# Altium footprint library Elettronica FM.PcbLib: 387 footprints (part 17 of 25)
Each footprint in its own frame and in the unit in brackets; x right, y up, seen from the top. Pads: shape width x height; smd on the part's side, far side on the other; paste and mask are expansions set on the pad; w line width, h text height; cw(c..) or ccw(c..) is an arc to the next point about the centre after c.
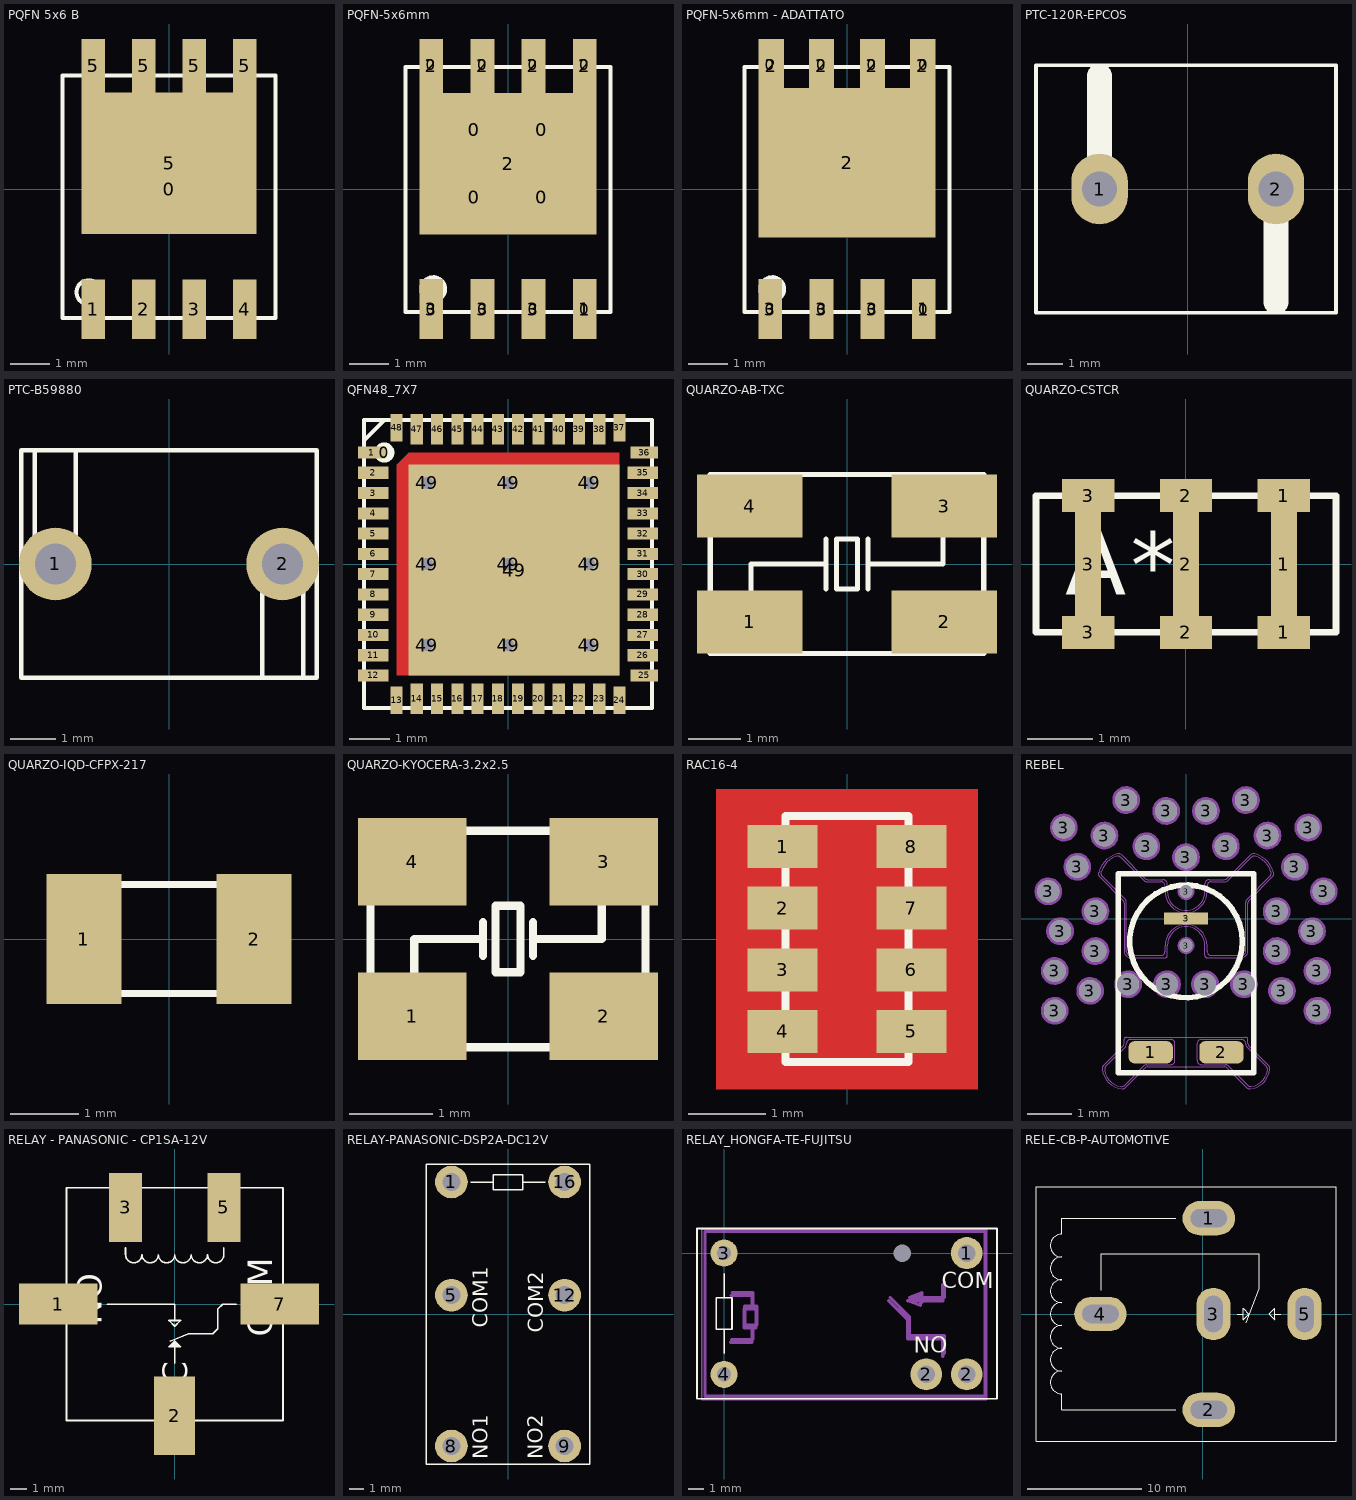
[diagram p16: the footprints below, top view; thin cyan lines are the x and y axes]

## PQFN 5x6 B [mm]
pads (10):
  round 0.8 on Top Overlay mask+0.1: 0(0,0)
  rect 0.6x1.5 smd mask+0: 1(-1.905,-3.02) 2(-0.635,-3.02) 3(0.635,-3.02) 4(1.905,-3.02)
  rect 0.6x1.35 smd mask+0: 5(-1.905,3.095) 5(-0.635,3.095) 5(0.635,3.095) 5(1.905,3.095)
  rect 4.41x3.545 smd mask+0: 5(0,0.647)
Top Overlay:
  circle w0.1: c-2.025,-2.595 r0.3
  lines w0.1: -2.675,-3.245 2.675,-3.245 2.675,2.855 -2.675,2.855 -2.675,-3.245

## PQFN-5x6mm [mm]
pads (21):
  rect 0.5x1.4 on Top Paste mask+0.1: 0(-1.925,-3) 0(-0.635,-3) 0(0.635,-3) 0(1.925,-3)
  rect 0.5x1.2 on Top Paste mask+0.1: 0(-1.925,3.125) 0(-0.635,3.125) 0(0.635,3.125) 0(1.925,3.125)
  rect 1.5x1.5 on Top Paste mask+0.1: 0(-0.85,-0.2) 0(-0.85,1.5) 0(0.85,-0.2) 0(0.85,1.5)
  rect 0.6x1.5 smd paste-5 mask+0: 1(1.925,-3) 3(-1.925,-3) 3(-0.635,-3) 3(0.635,-3)
  rect 0.6x1.35 smd paste-5 mask+0: 2(-1.925,3.1) 2(-0.635,3.1) 2(0.635,3.1) 2(1.925,3.1)
  rect 4.45x3.55 smd paste-5 mask+0: 2(0,0.65)
Top Overlay:
  circle w0.1: c-1.875,-2.5 r0.3
  lines w0.1: -2.575,-3.075 2.575,-3.075 2.575,3.075 -2.575,3.075 -2.575,-3.075
3D body: height 1.1, standoff 0, extent -2.575,-3.075 2.575,3.075

## PQFN-5x6mm - ADATTATO [mm]
pads (17):
  rect 0.5x1.4 on Top Paste mask+0.1: 0(-1.925,-3) 0(-0.635,-3) 0(0.635,-3) 0(1.925,-3)
  rect 0.5x1.2 on Top Paste mask+0.1: 0(-1.925,3.125) 0(-0.635,3.125) 0(0.635,3.125) 0(1.925,3.125)
  rect 0.6x1.5 smd paste-5 mask+0: 1(1.925,-3) 3(-1.925,-3) 3(-0.635,-3) 3(0.635,-3)
  rect 0.65x1.35 smd paste-5 mask+0: 2(-1.9,3.1) 2(1.9,3.1)
  rect 0.625x1.35 smd paste-5 mask+0: 2(-0.635,3.1) 2(0.635,3.1)
  rect 4.45x3.75 smd paste-5 mask+0: 2(0,0.675)
Top Overlay:
  circle w0.1: c-1.875,-2.5 r0.3
  lines w0.1: -2.575,-3.075 2.575,-3.075 2.575,3.075 -2.575,3.075 -2.575,-3.075
Top Paste:
  region: -2.025,2.35 -2.025,-1 2.025,-1 2.025,2.35
Top Solder:
  region: -2.225,3.775 -2.225,-1.2 2.225,-1.2 2.225,3.775 1.575,3.775 1.575,2.55 0.95,2.55 0.95,3.775 0.325,3.775 0.325,2.55 -0.325,2.55 -0.325,3.775 -0.95,3.775 -0.95,2.55 -1.575,2.55 -1.575,3.775
3D body: height 1.1, standoff 0, extent -2.575,-3.075 2.575,3.075

## PTC-120R-EPCOS [mm] "PTC, Diam 8.5, height 12mm, width 7mm Pitch=5mm, PLated"
height 12
pads (2):
  oval 1.6x2 hole 1: 1(-2.5,0) 2(2.5,0)
Top Overlay:
  lines w0.1: -4.3,-3.5 4.2,-3.5 4.2,3.5 -4.3,3.5 -4.3,-3.5
  lines w0.7: -2.5,0 -2.5,3.2 ; 2.5,-3.2 2.5,0
3D body: height 12.1, standoff 3.6, extent -4.25,-3.5 4.25,3.5

## PTC-B59880 [mm]
pads (2):
  round 1.6 hole 0.9: 1(-2.5,0) 2(2.5,0)
Top Overlay:
  lines w0.1: -2.95,2.5 -2.95,-0.45 -2.05,-0.45 -2.05,2.5 ; 2.05,-2.5 2.05,0.45 2.95,0.45 2.95,-2.5 ; -3.25,-2.5 3.25,-2.5 3.25,2.5 -3.25,2.5 -3.25,-2.5
3D body: height 10, standoff 3.5, extent -3.25,-2.5 3.25,2.5
3D body: height 5, standoff -4.3, extent 2.203,-0.299 2.8,0.3
3D body: height 5, standoff -4.3, extent -2.797,-0.299 -2.2,0.3

## QFN48_7X7 [mm]
pads (59):
  round 0.5 on Top Overlay paste+0 mask+0.05: 0(-3.05,2.75)
  rect 0.675x0.3 smd mask+0.05: 1(-3.363,2.75) 25(3.363,-2.75) 36(3.363,2.75)
  rect 0.75x0.3 smd mask+0.05: 2(-3.325,2.25) 3(-3.325,1.75) 4(-3.325,1.25) 5(-3.325,0.75) 6(-3.325,0.25) 7(-3.325,-0.25) 8(-3.325,-0.75) 9(-3.325,-1.25) 10(-3.325,-1.75) 11(-3.325,-2.25) 12(-3.325,-2.75) 26(3.325,-2.25) 27(3.325,-1.75) 28(3.325,-1.25) 29(3.325,-0.75) 30(3.325,-0.25) 31(3.325,0.25) 32(3.325,0.75) 33(3.325,1.25) 34(3.325,1.75) 35(3.325,2.25)
  rect 0.3x0.675 smd mask+0.05: 13(-2.75,-3.363) 24(2.75,-3.363) 37(2.75,3.363) 48(-2.75,3.363)
  rect 0.3x0.75 smd mask+0.05: 14(-2.25,-3.325) 15(-1.75,-3.325) 16(-1.25,-3.325) 17(-0.75,-3.325) 18(-0.25,-3.325) 19(0.25,-3.325) 20(0.75,-3.325) 21(1.25,-3.325) 22(1.75,-3.325) 23(2.25,-3.325) 38(2.25,3.325) 39(1.75,3.325) 40(1.25,3.325) 41(0.75,3.325) 42(0.25,3.325) 43(-0.25,3.325) 44(-0.75,3.325) 45(-1.25,3.325) 46(-1.75,3.325) 47(-2.25,3.325)
  round 0.7 hole 0.3 paste+0 mask+0.05: 49(-2,-2) 49(-2,0) 49(-2,2) 49(0,-2) 49(0,0) 49(0,2) 49(2,-2) 49(2,0) 49(2,2)
  rect 5.2x5.2 smd paste-50 mask+0.05: 49(0.15,-0.15)
Top Layer:
  region: 2.75,-2.75 -2.75,-2.75 -2.75,2.45 -2.45,2.75 2.75,2.75
Top Overlay:
  lines w0.1: -3.55,3.05 -3.05,3.55 ; -3.55,-3.55 3.55,-3.55 3.55,3.55 -3.55,3.55 -3.55,-3.55
Top Paste:
  region: -2.7,0.8 -1.1,0.8 -1.1,-0.8 -2.7,-0.8
  region: -2.7,2.425 -2.425,2.7 -1.1,2.7 -1.1,1.1 -2.7,1.1
  region: -0.8,2.7 0.8,2.7 0.8,1.1 -0.8,1.1
  region: 1.1,2.7 2.7,2.7 2.7,1.1 1.1,1.1
  region: 1.1,0.8 2.7,0.8 2.7,-0.8 1.1,-0.8
  region: 1.1,-1.1 2.7,-1.1 2.7,-2.7 1.1,-2.7
  region: -0.8,-1.1 0.8,-1.1 0.8,-2.7 -0.8,-2.7
  region: -2.7,-1.1 -1.1,-1.1 -1.1,-2.7 -2.7,-2.7
  region: -0.8,0.8 0.8,0.8 0.8,-0.8 -0.8,-0.8
Top Solder:
  region: -2.8,-2.8 -2.8,2.475 -2.475,2.8 2.8,2.8 2.8,-2.8
  lines w0.1: -3.65,3.15 -3.65,3.65 -3.15,3.65 ; 3.15,-3.65 3.65,-3.65 3.65,-3.15

## QUARZO-AB-TXC [mm]
pads (4):
  rect 2x1.2 smd: 1(-1.85,-1.1) 2(1.85,-1.1) 3(1.85,1.1) 4(-1.85,1.1)
Top Overlay:
  lines w0.1: -1.825,-0.85 -1.825,0 -0.4,0 ; -0.4,-0.475 -0.4,0.475 ; 0.4,-0.475 0.4,0.475 ; 0.4,0 1.825,0 1.825,0.85 ; 1.6,-1.7 1.6,-1.225 2.125,-0.7 2.6,-0.7 ; -2.6,-1.7 2.6,-1.7 2.6,1.7 -2.6,1.7 -2.6,-1.7 ; -0.2,-0.475 0.2,-0.475 0.2,0 0.2,0.475 -0.2,0.475 -0.2,0 -0.2,-0.475

## QUARZO-CSTCR [mm]
pads (9):
  rect 0.8x0.5 smd: 1(1.5,-1.05) 1(1.5,1.05) 2(0,-1.05) 2(0,1.05) 3(-1.5,-1.05) 3(-1.5,1.05)
  rect 0.4x1.6 smd: 1(1.5,0) 2(0,0) 3(-1.5,0)
Top Overlay:
  lines w0.1: -2.3,-1.05 -2.3,1.05 2.3,1.05 2.3,-1.05 -2.3,-1.05
  text "A" at -1.85,-0.475 h1
  text "*" at -0.85,-0.5 h1
3D body: height 1.2, standoff 0, extent -2.3,-1.05 2.3,1.05

## QUARZO-IQD-CFPX-217 [mm]
height 1.7
pads (2):
  rect 1.1x1.9 smd paste-0.05: 1(-1.25,0) 2(1.25,0)
Top Overlay:
  lines w0.1: -1.65,-0.8 -1.65,0.8 1.65,0.8 1.65,-0.8 -1.65,-0.8
3D body: height 0.9, standoff 0, extent -1.65,-0.8 1.65,0.8

## QUARZO-KYOCERA-3.2x2.5 [mm]
pads (4):
  rect 1.3x1.05 smd: 1(-1.15,-0.925) 2(1.15,-0.925) 3(1.15,0.925) 4(-1.15,0.925)
Top Overlay:
  lines w0.1: -1.125,-0.6 -1.125,0 -0.3,0 ; -0.3,-0.2 -0.3,0 ; -0.3,0.2 -0.3,0 ; 0.3,-0.2 0.3,0 ; 0.3,0.2 0.3,0 ; 1.125,0.6 1.125,0 0.3,0 ; -1.65,-1.3 1.65,-1.3 1.65,1.3 -1.65,1.3 -1.65,-1.3 ; -0.15,-0.4 0.15,-0.4 0.15,0.4 -0.15,0.4 -0.15,-0.4
3D body: height 0.6, standoff 0, extent -1.65,-1.3 1.65,1.3

## RAC16-4 [mil]
pads (8):
  rect 36x22 smd: 1(-33,47.25) 2(-33,15.75) 3(-33,-15.75) 4(-33,-47.25) 5(33,-47.25) 6(33,-15.75) 7(33,15.75) 8(33,47.25)
Top Layer:
  pour cut-out: -66.93,-76.77 -66.93,76.77 66.93,76.77 66.93,-76.77
Top Overlay:
  lines w3.94: -31.5,-53.15 -19.68,-53.15 -19.68,-41.34 -31.5,-41.34 ; -31.5,-21.65 -19.69,-21.65 -19.69,-9.84 -31.5,-9.84 ; -31.5,9.84 -19.69,9.84 -19.69,21.65 -31.5,21.65 ; 31.5,-53.15 19.68,-53.15 19.68,-41.34 31.5,-41.34 ; 31.5,-21.65 19.69,-21.65 19.69,-9.84 31.5,-9.84 ; -31.5,-62.99 -31.5,62.99 31.5,62.99 31.5,-62.99 -31.5,-62.99 ; -31.5,41.34 -19.69,41.34 -19.69,53.15 -31.5,53.15 -31.5,41.34 ; 19.69,9.84 19.69,21.65 31.5,21.65 31.5,9.84 19.69,9.84 ; 19.69,41.34 19.69,53.15 31.5,53.15 31.5,41.34 19.69,41.34

## REBEL [mm]
pads (36):
  rrect50% 1x0.5 smd: 1(-0.8,-3.025) 2(0.8,-3.025)
  round 0.5 hole 0.5 mask+0.05: 3(-3.118,0.616) 3(-2.971,-1.186) 3(-2.969,-2.085) 3(-2.85,-0.286) 3(-2.766,2.059) 3(-2.462,1.172) 3(-2.173,-1.636) 3(-2.052,-0.737) 3(-2.051,0.165) 3(-1.846,1.877) 3(-1.356,2.68) 3(-1.31,-1.487) 3(-0.901,1.635) 3(-0.452,2.433) 3(-0.432,-1.486) 3(-0.002,1.383) 3(0.43,-1.486) 3(0.452,2.434) 3(0.899,1.635) 3(1.31,-1.486) 3(1.356,2.679) 3(1.844,1.878) 3(2.05,-0.736) 3(2.051,0.164) 3(2.17,-1.636) 3(2.461,1.171) 3(2.764,2.059) 3(2.845,-0.287) 3(2.97,-1.184) 3(2.972,-2.091) 3(3.116,0.614)
  rect 1x0.27 smd mask+0.05: 3(0,0)
  round 0.25 hole 0.3 mask+0.15: 3(0,-0.611) 3(0,0.609)
Top Overlay:
  circle w0.127: c0,-0.516 r1.275
  lines w0.127: -1.53,-3.486 1.53,-3.486 1.53,1.014 -1.53,1.014 -1.53,-3.486
Top Paste:
  lines w0.127: 1.35,-2.84 ccw(c1.45,-2.84) 1.379,-2.911 1.815,-3.347 cw(c1.745,-3.418) 1.843,-3.435 cw(c1.4,-3.356) 1.479,-3.799 cw(c1.462,-3.701) 1.391,-3.771 0.955,-3.335 ccw(c0.884,-3.406) 0.884,-3.306 0.35,-3.306 cw(c0.35,-3.206) 0.25,-3.206 0.25,-2.836 cw(c0.35,-2.836) 0.35,-2.736 1.25,-2.736 cw(c1.25,-2.836) 1.35,-2.836 1.35,-2.84 ; -1.921,1.06 ccw(c-1.826,1.028) -1.897,0.957 -1.379,0.439 cw(c-1.45,0.368) -1.35,0.368 -1.35,-0.736 ccw(c-1.25,-0.736) -1.25,-0.836 -0.575,-0.836 ccw(c-0.575,-0.736) -0.475,-0.736 -0.475,-0.611 cw(c0,-0.611) 0,-0.136 cw(c0,-0.611) 0.475,-0.611 0.475,-0.736 ccw(c0.575,-0.736) 0.575,-0.836 1.25,-0.836 ccw(c1.25,-0.736) 1.35,-0.736 1.35,0.368 cw(c1.45,0.368) 1.379,0.439 1.897,0.957 ccw(c1.826,1.028) 1.921,1.06 ccw(c1.4,0.884) 1.576,1.405 ccw(c1.544,1.31) 1.473,1.381 0.955,0.863 cw(c0.884,0.934) 0.884,0.834 0.575,0.834 ccw(c0.575,0.734) 0.475,0.734 0.475,0.609 cw(c0,0.609) 0,0.134 cw(c0,0.609) -0.475,0.609 -0.475,0.734 ccw(c-0.575,0.734) -0.575,0.834 -0.884,0.834 cw(c-0.884,0.934) -0.955,0.863 -1.473,1.381 ccw(c-1.544,1.31) -1.576,1.405 ccw(c-1.4,0.884) -1.921,1.06 ; -1.843,-3.435 cw(c-1.744,-3.418) -1.815,-3.347 -1.379,-2.911 ccw(c-1.45,-2.84) -1.35,-2.84 -1.35,-2.836 cw(c-1.25,-2.836) -1.25,-2.736 -0.35,-2.736 cw(c-0.35,-2.836) -0.25,-2.836 -0.25,-3.206 cw(c-0.35,-3.206) -0.35,-3.306 -0.884,-3.306 ccw(c-0.884,-3.406) -0.955,-3.335 -1.391,-3.771 cw(c-1.462,-3.701) -1.479,-3.799 cw(c-1.4,-3.356) -1.843,-3.435
Top Solder:
  lines w0.127: 0.859,0.883 ccw(c0.859,0.983) 0.93,0.912 1.459,1.438 cw(c1.529,1.367) 1.555,1.464 cw(c1.4,0.884) 1.98,1.039 cw(c1.883,1.013) 1.954,0.943 1.429,0.418 ccw(c1.5,0.348) 1.4,0.348 1.4,-0.736 cw(c1.25,-0.736) 1.25,-0.886 0.475,-0.886 cw(c0.475,-0.836) 0.425,-0.836 0.425,-0.611 ccw(c0,-0.611) -0.425,-0.611 -0.425,-0.836 cw(c-0.475,-0.836) -0.475,-0.886 -1.25,-0.886 cw(c-1.25,-0.736) -1.4,-0.736 -1.4,0.348 ccw(c-1.5,0.348) -1.429,0.418 -1.954,0.943 cw(c-1.883,1.013) -1.98,1.039 cw(c-1.4,0.884) -1.555,1.464 cw(c-1.529,1.367) -1.459,1.438 -0.93,0.909 ccw(c-0.859,0.979) -0.859,0.879 -0.526,0.881 cw(c-0.525,0.781) -0.425,0.781 -0.425,0.609 ccw(c0,0.609) 0.425,0.609 0.425,0.782 cw(c0.525,0.782) 0.525,0.882 0.86,0.883 ; -1.897,-3.411 ccw(c-1.4,-3.356) -1.455,-3.853 ; -1.897,-3.411 cw(c-1.798,-3.4) -1.868,-3.329 -1.429,-2.89 ; -1.897,-3.411 cw(c-1.798,-3.4) -1.868,-3.329 -1.429,-2.89 ; -1.897,-3.411 ccw(c-1.4,-3.356) -1.455,-3.853 ; -1.455,-3.853 ccw(c-1.444,-3.754) -1.373,-3.824 ; -1.455,-3.853 ccw(c-1.444,-3.754) -1.373,-3.824 ; -1.429,-2.89 ccw(c-1.5,-2.82) -1.4,-2.82 ; -1.429,-2.89 ccw(c-1.5,-2.82) -1.4,-2.82 ; -1.4,-2.82 -1.4,-2.736 ; -1.4,-2.82 -1.4,-2.736 ; -1.4,-2.736 cw(c-1.35,-2.736) -1.35,-2.686 ; -1.4,-2.736 cw(c-1.35,-2.736) -1.35,-2.686 ; -1.373,-3.824 -0.934,-3.385 ; -1.373,-3.824 -0.934,-3.385 ; -1.35,-2.686 1.35,-2.686 ; -1.35,-2.686 1.35,-2.686 ; -0.934,-3.385 cw(c-0.864,-3.456) -0.864,-3.356 ; -0.934,-3.385 cw(c-0.864,-3.456) -0.864,-3.356 ; -0.864,-3.356 0.864,-3.356 ; -0.864,-3.356 0.864,-3.356 ; 0.864,-3.356 cw(c0.864,-3.456) 0.934,-3.385 ; 0.864,-3.356 cw(c0.864,-3.456) 0.934,-3.385 ; 0.934,-3.385 1.373,-3.824 ; 0.934,-3.385 1.373,-3.824 ; 1.35,-2.686 cw(c1.35,-2.736) 1.4,-2.736 ; 1.35,-2.686 cw(c1.35,-2.736) 1.4,-2.736 ; 1.373,-3.824 ccw(c1.444,-3.754) 1.455,-3.853 ; 1.373,-3.824 ccw(c1.444,-3.754) 1.455,-3.853 ; 1.4,-2.82 ccw(c1.5,-2.82) 1.429,-2.89 ; 1.4,-2.82 ccw(c1.5,-2.82) 1.429,-2.89 ; 1.4,-2.82 1.4,-2.736 ; 1.4,-2.82 1.4,-2.736 ; 1.429,-2.89 1.868,-3.329 cw(c1.798,-3.4) 1.897,-3.411 ; 1.429,-2.89 1.868,-3.329 cw(c1.798,-3.4) 1.897,-3.411 ; 1.455,-3.853 ccw(c1.4,-3.356) 1.897,-3.411 ; 1.455,-3.853 ccw(c1.4,-3.356) 1.897,-3.411
Mechanical 3:
  lines w0: -1.35,-2.84 cw(c-1.45,-2.84) -1.379,-2.911 -1.815,-3.347 ccw(c-1.744,-3.418) -1.843,-3.435 ccw(c-1.4,-3.356) -1.479,-3.799 ccw(c-1.462,-3.701) -1.391,-3.771 -0.955,-3.335 cw(c-0.884,-3.406) -0.884,-3.306 -0.35,-3.306 ccw(c-0.35,-3.206) -0.25,-3.206 -0.25,-2.836 ccw(c-0.35,-2.836) -0.35,-2.736 -1.25,-2.736 ccw(c-1.25,-2.836) -1.35,-2.836 -1.35,-2.84 ; 1.35,-2.84 ccw(c1.45,-2.84) 1.379,-2.911 1.815,-3.347 cw(c1.745,-3.418) 1.843,-3.435 cw(c1.4,-3.356) 1.479,-3.799 cw(c1.462,-3.701) 1.391,-3.771 0.955,-3.335 ccw(c0.884,-3.406) 0.884,-3.306 0.35,-3.306 cw(c0.35,-3.206) 0.25,-3.206 0.25,-2.836 cw(c0.35,-2.836) 0.35,-2.736 1.25,-2.736 cw(c1.25,-2.836) 1.35,-2.836 1.35,-2.84 ; -1.921,1.06 cw(c-1.4,0.884) -1.576,1.405 cw(c-1.544,1.31) -1.473,1.381 -0.955,0.863 ccw(c-0.884,0.934) -0.884,0.834 -0.575,0.834 cw(c-0.575,0.734) -0.475,0.734 -0.475,0.609 ccw(c0,0.609) 0,0.134 ccw(c0,0.609) 0.475,0.609 0.475,0.734 cw(c0.575,0.734) 0.575,0.834 0.884,0.834 ccw(c0.884,0.934) 0.955,0.863 1.473,1.381 cw(c1.544,1.31) 1.576,1.405 cw(c1.4,0.884) 1.921,1.06 cw(c1.826,1.028) 1.897,0.957 1.379,0.439 ccw(c1.45,0.368) 1.35,0.368 1.35,-0.736 cw(c1.25,-0.736) 1.25,-0.836 0.575,-0.836 cw(c0.575,-0.736) 0.475,-0.736 0.475,-0.611 ccw(c0,-0.611) 0,-0.136 ccw(c0,-0.611) -0.475,-0.611 -0.475,-0.736 cw(c-0.575,-0.736) -0.575,-0.836 -1.25,-0.836 cw(c-1.25,-0.736) -1.35,-0.736 -1.35,0.368 ccw(c-1.45,0.368) -1.379,0.439 -1.897,0.957 cw(c-1.826,1.028) -1.921,1.06
Mechanical 4:
  circle w0.127: c2.971,-2.086 r0.25
  circle w0.127: c2.971,-1.186 r0.25
  circle w0.127: c2.85,-0.286 r0.25
  circle w0.127: c2.05,0.164 r0.25
  circle w0.127: c2.05,-0.736 r0.25
  circle w0.127: c2.171,-1.636 r0.25
  circle w0.127: c2.764,2.059 r0.25
  circle w0.127: c3.116,0.614 r0.25
  circle w0.127: c2.461,1.171 r0.25
  circle w0.127: c1.844,1.878 r0.25
  circle w0.127: c0.9,1.634 r0.25
  circle w0.127: c0,1.384 r0.25
  circle w0.127: c0.45,2.434 r0.25
  circle w0.127: c1.356,2.679 r0.25
  circle w0.127: c1.31,-1.486 r0.25
  circle w0.127: c0.43,-1.486 r0.25
  circle w0.127: c0,-0.611 r0.125
  circle w0.127: c0,0.609 r0.125
  circle w0.127: c-2.971,-2.086 r0.25
  circle w0.127: c-2.971,-1.186 r0.25
  circle w0.127: c-2.85,-0.286 r0.25
  circle w0.127: c-2.05,0.164 r0.25
  circle w0.127: c-2.05,-0.736 r0.25
  circle w0.127: c-2.171,-1.636 r0.25
  circle w0.127: c-2.764,2.059 r0.25
  circle w0.127: c-3.116,0.614 r0.25
  circle w0.127: c-2.461,1.171 r0.25
  circle w0.127: c-1.844,1.878 r0.25
  circle w0.127: c-0.9,1.634 r0.25
  circle w0.127: c-0.45,2.434 r0.25
  circle w0.127: c-1.356,2.679 r0.25
  circle w0.127: c-1.31,-1.486 r0.25
  circle w0.127: c-0.43,-1.486 r0.25
Mechanical 6:
  lines w0: 0.859,0.883 ccw(c0.859,0.983) 0.93,0.912 1.459,1.438 cw(c1.529,1.367) 1.555,1.464 cw(c1.4,0.884) 1.98,1.039 cw(c1.883,1.013) 1.954,0.943 1.429,0.418 ccw(c1.5,0.348) 1.4,0.348 1.4,-0.736 cw(c1.25,-0.736) 1.25,-0.886 0.475,-0.886 cw(c0.475,-0.836) 0.425,-0.836 0.425,-0.611 ccw(c0,-0.611) -0.425,-0.611 -0.425,-0.836 cw(c-0.475,-0.836) -0.475,-0.886 -1.25,-0.886 cw(c-1.25,-0.736) -1.4,-0.736 -1.4,0.348 ccw(c-1.5,0.348) -1.429,0.418 -1.954,0.943 cw(c-1.883,1.013) -1.98,1.039 cw(c-1.4,0.884) -1.555,1.464 cw(c-1.529,1.367) -1.459,1.438 -0.93,0.909 ccw(c-0.859,0.979) -0.859,0.879 -0.526,0.881 cw(c-0.525,0.781) -0.425,0.781 -0.425,0.609 ccw(c0,0.609) 0.425,0.609 0.425,0.782 cw(c0.525,0.782) 0.525,0.882 0.86,0.883 ; -1.897,-3.411 cw(c-1.798,-3.4) -1.868,-3.329 -1.429,-2.89 ccw(c-1.5,-2.82) -1.4,-2.82 -1.4,-2.736 cw(c-1.35,-2.736) -1.35,-2.686 1.35,-2.686 cw(c1.35,-2.736) 1.4,-2.736 1.4,-2.82 ccw(c1.5,-2.82) 1.429,-2.89 1.868,-3.329 cw(c1.798,-3.4) 1.897,-3.411 cw(c1.4,-3.356) 1.455,-3.853 cw(c1.444,-3.754) 1.373,-3.824 0.934,-3.385 ccw(c0.864,-3.456) 0.864,-3.356 -0.864,-3.356 ccw(c-0.864,-3.456) -0.934,-3.385 -1.373,-3.824 cw(c-1.444,-3.754) -1.455,-3.853 cw(c-1.4,-3.356) -1.897,-3.411

## RELAY - PANASONIC - CP1SA-12V [mm]
height 16
pads (5):
  rect 4.8x2.5 smd mask+0.1: 1(-7.1,0) 7(6.4,0)
  rect 2.5x4.8 smd mask+0.1: 2(0,-6.8)
  rect 2x4.2 smd mask+0.1: 3(-3,5.9) 5(3,5.9)
Top Overlay:
  region: 0,-2.25 -0.35,-2.6 0.35,-2.6
  lines w0.1: -4.1,0 0,0 0,-1 ; -3,3.425 -3,3.025 ccw(c-2.5,3.025) -2,3.025 ccw(c-1.5,3.025) -1,3.025 ccw(c-0.5,3.025) 0,3.025 ccw(c0.5,3.025) 1,3.025 ccw(c1.5,3.025) 2,3.025 ccw(c2.5,3.025) 3,3.025 3,3.425 ; -0.275,-2.25 0.85,-1.8 2.325,-1.8 2.625,-1.5 2.625,-0.3 2.925,0 3.75,0 ; 0,-3.6 0,-2.6 ; 0,-2.6 -0.35,-2.6 0,-2.25 0.35,-2.6 0,-2.6 ; 0,-1 -0.35,-1 0,-1.35 0.35,-1 0,-1 ; -6.6,-7.1 6.6,-7.1 6.6,7.1 -6.6,7.1 -6.6,-7.1
  text "NO" at -4.45,-1.25 h1.5
  text "NC" at 0.75,-6.45 h1.5
  text "COM" at 5.95,-2 h1.5
3D body: height 10.5, standoff 0, extent -6.6,-7.1 6.6,7.1

## RELAY-PANASONIC-DSP2A-DC12V [mm]
pads (6):
  round 2.2 hole 1.2: 1(-3.81,8.89) 5(-3.81,1.27) 8(-3.81,-8.89) 9(3.81,-8.89) 12(3.81,1.27) 16(3.81,8.89)
Top Overlay:
  lines w0.1: -2.5,8.875 -1,8.875 ; 1,8.875 2.5,8.875 ; -5.5,-10.1 5.5,-10.1 5.5,10.1 -5.5,10.1 -5.5,-10.1 ; -1,8.375 -1,9.375 1,9.375 1,8.375 -1,8.375
  text "NO1" at -1.35,-9.775 h1
  text "COM1" at -1.375,-0.925 h1
  text "COM2" at 2.375,-1.25 h1
  text "NO2" at 2.35,-9.775 h1
3D body: height 10.5, standoff 1, extent -5.5,-10.125 5.5,10.1

## RELAY_HONGFA-TE-FUJITSU [mm] "Relay HONGFA H32FA-T/012-HSL2 Serie Plated"
height 12.3
pads (6):
  round 2 hole 1.1: 1(15.24,0) 2(12.7,-7.62) 2(15.24,-7.62)
  round 1.7 hole 0.9: 3(0,0) 4(0,-7.62)
  round 0 hole 1.1 unplated: 5(11.2,0)
Top Overlay:
  lines w0.1: 0,-6.3 0,-4.8 ; 0,-2.8 0,-1.3 ; -1.7,-9.16 -1.7,1.54 17.145,1.54 17.145,-9.16 -1.7,-9.16 ; -0.5,-4.8 -0.5,-2.8 0.5,-2.8 0.5,-4.8 -0.5,-4.8
  text "NO" at 11.9,-6.275 h1
  text "COM" at 13.675,-2.2 h1
Mechanical 14:
  lines w0.1: -1.2,-9 16.4,-9 16.4,1.36 -1.2,1.36 -1.2,-9
  lines w0.2: 0.475,-5.425 1.8,-5.425 1.8,-4.6 ; 0.5,-2.475 1.8,-2.475 1.8,-3.325 ; 10.44,-2.795 11.64,-3.995 11.64,-4.195 11.64,-5.195 13.84,-5.195 13.84,-6.295 ; 13.84,-1.795 13.84,-2.795 11.64,-2.795 ; 1.3,-4.525 2.05,-4.525 2.05,-3.325 1.3,-3.325 1.3,-4.525 ; 1.3,-4.525 1.3,-4.525 ; 11.64,-2.795 12.44,-2.495 12.44,-3.095 11.64,-2.795
  text ".Designator" at 2.2,-8 h1.52
Mechanical 15:
  lines w0.1: -1.4,-9.2 16.5,-9.2 16.5,1.5 -1.4,1.5 -1.4,-9.2
Mechanical 16:
  lines w0.2: 0.425,-5.61 1.75,-5.61 1.75,-4.785 ; 0.45,-2.66 1.75,-2.66 1.75,-3.51 ; 10.34,-2.995 11.54,-4.195 11.54,-4.395 11.54,-5.395 13.74,-5.395 13.74,-6.495 ; 13.74,-1.995 13.74,-2.995 11.54,-2.995 ; 1.25,-4.71 2,-4.71 2,-3.51 1.25,-3.51 1.25,-4.71 ; 1.25,-4.71 1.25,-4.71 ; 11.54,-2.995 12.34,-2.695 12.34,-3.295 11.54,-2.995 ; -1.2,-9 16.4,-9 16.4,1.36 -1.2,1.36 -1.2,-9
3D body: height 15.7, standoff 0, extent -1.7,-9.16 17.145,1.54
3D body: height 12.3, standoff 0, extent -1.4,-9.2 16.5,1.5

## RELE-CB-P-AUTOMOTIVE [mm]
pads (5):
  oval 4.6x3 hole 1.6 slot 3.2 at 0 deg: 1(0.55,8.4) 2(0.55,-8.4) 4(-8.95,0)
  oval 3x4.6 hole 1.6 slot 3.2 at 90 deg: 3(0.95,0) 5(8.95,0)
Top Overlay:
  lines w0.1: -8.9,2.1 -8.9,5.3 4.95,5.3 4.95,2.2 3.85,-0.75 ; -2.35,-8.4 -12.35,-8.4 -12.35,-7 cw(c-12.35,-6) -12.35,-5 cw(c-12.35,-4) -12.35,-3 cw(c-12.35,-2) -12.35,-1 cw(c-12.35,0) -12.35,1 cw(c-12.35,2) -12.35,3 cw(c-12.35,4) -12.35,5 cw(c-12.35,6) -12.35,7 -12.35,8.4 -2.35,8.4 ; 3.05,0 3.55,0 ; 6.85,0 6.35,0 ; 3.55,0 3.55,0.5 4.05,0 3.55,-0.5 3.55,0 ; 6.35,0 6.35,0.5 5.85,0 6.35,-0.5 6.35,0 ; -14.6,-11.15 -14.6,11.15 11.7,11.15 11.7,-11.15 -14.6,-11.15
3D body: height 26.3, standoff 0, extent -14.6,-11.15 11.7,11.15